# Altium footprint library 元件2.PcbLib: 204 footprints (part 11 of 13)
Each footprint in its own frame and in the unit in brackets; x right, y up, seen from the top. Pads: shape width x height; smd on the part's side, far side on the other; paste and mask are expansions set on the pad; w line width, h text height; cw(c..) or ccw(c..) is an arc to the next point about the centre after c.
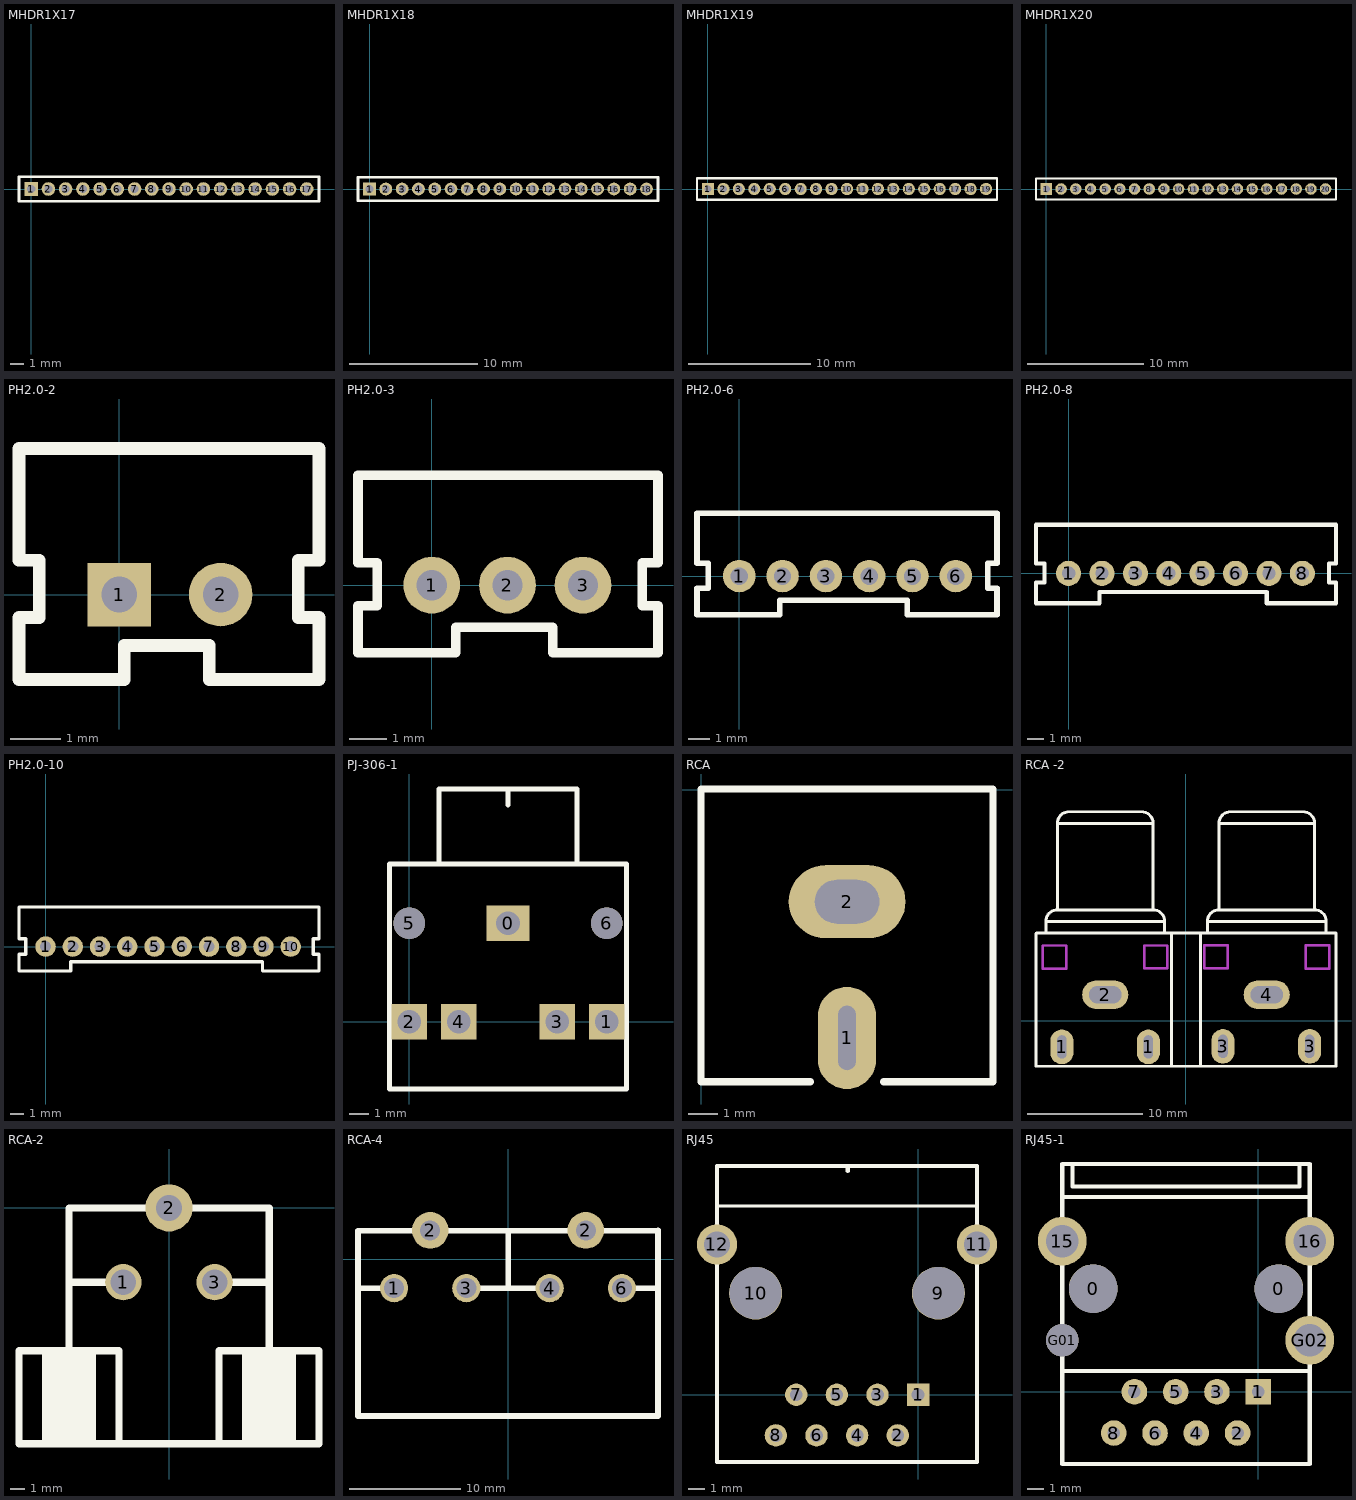
[diagram p10: the footprints below, top view; thin cyan lines are the x and y axes]

## MHDR1X17 [mm] "Connector; Header; 17 Position"
pads (17):
  rect 1x1 hole 0.6: 1(0,0)
  round 1 hole 0.6: 2(1.27,0) 3(2.54,0) 4(3.81,0) 5(5.08,0) 6(6.35,0) 7(7.62,0) 8(8.89,0) 9(10.16,0) 10(11.43,0) 11(12.7,0) 12(13.97,0) 13(15.24,0) 14(16.51,0) 15(17.78,0) 16(19.05,0) 17(20.32,0)
Top Overlay:
  lines w0.2: -0.9,-0.9 21.22,-0.9 21.22,0.9 -0.9,0.9 -0.9,-0.9
3D body "mhdr17.STEP": height 10.15, standoff 0, extent -1.27,-1.27 21.59,1.27

## MHDR1X18 [mm] "Connector; Header; 18 Position"
pads (18):
  rect 1x1 hole 0.6: 1(0,0)
  round 1 hole 0.6: 2(1.27,0) 3(2.54,0) 4(3.81,0) 5(5.08,0) 6(6.35,0) 7(7.62,0) 8(8.89,0) 9(10.16,0) 10(11.43,0) 11(12.7,0) 12(13.97,0) 13(15.24,0) 14(16.51,0) 15(17.78,0) 16(19.05,0) 17(20.32,0) 18(21.59,0)
Top Overlay:
  lines w0.2: -0.9,-0.9 22.49,-0.9 22.49,0.9 -0.9,0.9 -0.9,-0.9
3D body "mhdr18.STEP": height 10.15, standoff 0, extent -1.27,-1.27 22.86,1.27

## MHDR1X19 [mm] "Connector; Header; 19 Position"
pads (19):
  rect 1x1 hole 0.6: 1(0,0)
  round 1 hole 0.6: 2(1.27,0) 3(2.54,0) 4(3.81,0) 5(5.08,0) 6(6.35,0) 7(7.62,0) 8(8.89,0) 9(10.16,0) 10(11.43,0) 11(12.7,0) 12(13.97,0) 13(15.24,0) 14(16.51,0) 15(17.78,0) 16(19.05,0) 17(20.32,0) 18(21.59,0) 19(22.86,0)
Top Overlay:
  lines w0.2: -0.9,-0.9 -0.9,0.9 23.76,0.9 23.76,-0.9 -0.9,-0.9
3D body "mhdr19.STEP": height 10.15, standoff 0, extent -1.27,-1.27 24.13,1.27

## MHDR1X20 [mm] "Connector; Header; 20 Position"
pads (20):
  rect 1x1 hole 0.6: 1(0,0)
  round 1 hole 0.6: 2(1.27,0) 3(2.54,0) 4(3.81,0) 5(5.08,0) 6(6.35,0) 7(7.62,0) 8(8.89,0) 9(10.16,0) 10(11.43,0) 11(12.7,0) 12(13.97,0) 13(15.24,0) 14(16.51,0) 15(17.78,0) 16(19.05,0) 17(20.32,0) 18(21.59,0) 19(22.86,0) 20(24.13,0)
Top Overlay:
  lines w0.2: -0.9,-0.9 -0.9,0.9 25.03,0.9 25.03,-0.9 -0.9,-0.9
3D body "mhdr20.STEP": height 10.15, standoff 0, extent -1.27,-1.27 25.4,1.27

## PH2.0-2 [mil]
pads (2):
  rect 50x50 hole 28: 1(0,0)
  round 50 hole 28: 2(80,0)
Top Overlay:
  lines w10: -78.8,-66.93 -78.8,-18.06 -62.82,-18.06 -62.82,26.94 -78.8,26.94 -78.8,115 157.42,115 157.42,26.94 141,26.94 141,-18.06 157.42,-18.06 157.42,-66.93 71,-66.93 71,-40.19 4,-40.19 4,-66.93 -78.8,-66.93
3D body "PH2.step": height 236.22, standoff -133.86, extent -76.13,-65.57 156.15,111.59

## PH2.0-3 [mm]
pads (3):
  round 1.5 hole 0.8: 1(0,0) 2(2,0) 3(4,0)
Top Overlay:
  lines w0.254: -1.952,-1.791 -1.952,-0.55 -1.444,-0.55 -1.444,0.593 -1.952,0.593 -1.952,2.909 5.983,2.909 5.983,0.593 5.566,0.593 5.566,-0.55 5.983,-0.55 5.983,-1.791 3.2,-1.791 3.2,-1.112 0.635,-1.112 0.635,-1.791 -1.952,-1.791
3D body "PH3.step": height 6, standoff -3.4, extent -1.943,-1.681 5.957,2.819

## PH2.0-6 [mm]
pads (6):
  round 1.5 hole 0.8: 1(0,0) 2(2,0) 3(4,0) 4(6,0) 5(8,0) 6(10,0)
Top Overlay:
  lines w0.254: -1.952,-1.791 -1.952,-0.55 -1.444,-0.55 -1.444,0.593 -1.952,0.593 -1.952,2.909 11.902,2.909 11.902,0.593 11.485,0.593 11.485,-0.55 11.902,-0.55 11.902,-1.791 7.751,-1.791 7.751,-1.112 3.509,-1.112 1.858,-1.112 1.858,-1.791 -1.952,-1.791
3D body "PH6.step": height 6, standoff -3, extent -1.946,-1.702 11.954,2.798

## PH2.0-8 [mm]
pads (8):
  round 1.5 hole 0.8: 1(0,0) 2(2,0) 3(4,0) 4(6,0) 5(8,0) 6(10,0) 7(12,0) 8(14,0)
Top Overlay:
  lines w0.254: -1.952,-1.791 1.858,-1.791 1.858,-1.112 3.509,-1.112 11.866,-1.112 11.866,-1.791 16.016,-1.791 16.016,-0.55 15.599,-0.55 15.599,0.593 16.016,0.593 16.016,2.909 -1.952,2.909 -1.952,0.593 -1.444,0.593 -1.444,-0.55 -1.952,-0.55 -1.952,-1.791
3D body "PH8.step": height 6, standoff -3, extent -1.94,-1.676 15.96,2.824

## PH2.0-10 [mm]
pads (10):
  round 1.5 hole 0.8: 1(0,0) 2(2,0) 3(4,0) 4(6,0) 5(8,0) 6(10,0) 7(12,0) 8(14,0) 9(16,0) 10(18,0)
Top Overlay:
  lines w0.254: -1.952,-1.791 1.858,-1.791 1.858,-1.112 3.509,-1.112 15.93,-1.112 15.93,-1.791 20.08,-1.791 20.08,-0.55 19.663,-0.55 19.663,0.593 20.08,0.593 20.08,2.909 -1.952,2.909 -1.952,0.593 -1.444,0.593 -1.444,-0.55 -1.952,-0.55 -1.952,-1.791
3D body "PH10.step": height 6, standoff -3, extent -1.952,-1.695 19.948,2.805

## PJ-306-1 [mm]
pads (7):
  rect 2.2x1.8 hole 1.2: 0(5,5)
  rect 1.8x1.8 hole 1.2: 1(10,0) 2(0,0) 3(7.5,0) 4(2.5,0)
  round 1.6 hole 1.6 unplated: 5(0,5) 6(10,5)
Top Overlay:
  lines w0.254: 1.5,8 1.5,11.8 8.4,11.8 ; 5,11 5,11.8 ; 8.5,8 8.5,11.8 ; -1,-3.4 -1,8 11,8 11,-3.4 -1,-3.4
3D body "耳机.ST": height 3.2, standoff -10.8, extent -1.041,-3.689 11.059,11.411

## RCA [mm]
pads (2):
  oval 2x3.5 hole 0.6 slot 2.2 at 90 deg: 1(5,-8.5)
  oval 4x2.5 hole 1.5 slot 2.2 at 0 deg: 2(5.004,-3.835)
Top Overlay:
  lines w0.254: 3.75,-10 0,-10 0,0.025 10,0.025 10,-10 6.25,-10
3D body "RCA.step": height 13, standoff -3.99, extent -0.025,-9.881 9.982,9.627

## RCA -2 [mm]
pads (6):
  oval 2x3 hole 0.8 slot 2 at 90 deg: 1(-10.738,-2.261) 1(-3.245,-2.261) 3(3.219,-2.21) 3(10.738,-2.21)
  oval 4x2.5 hole 1.5 slot 2.8 at 0 deg: 2(-6.979,2.261) 4(7.017,2.261)
Top Overlay:
  lines w0.254: -1.226,-3.861 -1.226,7.569 ; 1.289,-3.861 1.289,7.595 ; 13.008,7.601 -12.954,7.601 -12.98,7.575 -12.98,-3.937 13.018,-3.937 13.018,7.617 ; -12.13,8.617 cw(c-11.13,8.617) -11.13,9.617 ; -12.13,8.617 -12.13,7.617 -12.13,8.617 ; -12.13,8.617 -1.83,8.617 ; -11.13,9.617 -11.13,17.117 ; -11.13,9.617 -2.83,9.617 ; -11.13,17.117 cw(c-10.13,17.117) -10.13,18.117 -3.83,18.117 cw(c-3.83,17.117) -2.83,17.117 ; -11.13,17.117 -2.83,17.117 ; -2.83,9.617 cw(c-2.83,8.617) -1.83,8.617 ; -2.83,9.617 -2.83,17.117 ; -2.83,9.617 -2.83,17.117 ; -1.83,8.617 -1.83,7.617 -1.83,8.617 ; 1.87,8.617 cw(c2.87,8.617) 2.87,9.617 ; 1.87,8.617 1.87,7.617 1.87,8.617 ; 1.87,8.617 12.17,8.617 ; 2.87,9.617 2.87,17.117 ; 2.87,9.617 2.87,17.117 ; 2.87,9.617 11.17,9.617 ; 2.87,17.117 cw(c3.87,17.117) 3.87,18.117 10.17,18.117 cw(c10.17,17.117) 11.17,17.117 ; 2.87,17.117 11.17,17.117 ; 11.17,9.617 cw(c11.17,8.617) 12.17,8.617 ; 11.17,9.617 11.17,17.117 ; 11.17,9.617 11.17,17.117 ; 12.17,7.617 12.17,8.617 ; 12.17,7.617 12.17,8.617 ; 12.17,7.617 12.17,8.617 ; 12.17,7.617 12.17,8.617
Keep-Out Layer:
  lines w0.2: -12.395,4.521 -10.363,4.521 -10.363,6.528 -12.395,6.528 -12.395,4.521 ; -3.607,4.547 -3.607,6.528 -1.6,6.528 -1.6,4.547 -3.607,4.547 ; 1.6,4.547 3.632,4.547 3.632,6.553 1.6,6.553 1.6,4.547 ; 10.389,4.521 12.421,4.521 12.421,6.553 10.389,6.553 10.389,4.521
Mechanical 1:
  lines w0.2: -12.395,4.521 -12.395,6.528 -10.363,6.528 -10.363,4.521 -12.395,4.521 ; -3.607,4.547 -1.6,4.547 -1.6,6.528 -3.607,6.528 -3.607,4.547 ; 1.6,4.547 1.6,6.553 3.632,6.553 3.632,4.547 1.6,4.547 ; 10.389,4.521 10.389,6.553 12.421,6.553 12.421,4.521 10.389,4.521
Mechanical 2:
  lines w0.254: -11.225,-3.289 -11.225,-1.289 -10.225,-1.289 -10.225,-3.289 -11.225,-3.289 ; -8.23,1.649 -8.23,2.849 -5.73,2.849 -5.73,1.649 -8.23,1.649 ; -3.725,-3.289 -3.725,-1.289 -2.725,-1.289 -2.725,-3.289 -3.725,-3.289 ; 2.753,-3.238 2.753,-1.238 3.753,-1.238 3.753,-3.238 2.753,-3.238 ; 5.77,1.649 5.77,2.849 8.27,2.849 8.27,1.649 5.77,1.649 ; 10.253,-3.238 10.253,-1.238 11.253,-1.238 11.253,-3.238 10.253,-3.238
3D body "av2-8-4-13.STEP": height 2.5, standoff -17, extent -12.986,-6.579 13.012,18.121

## RCA-2 [mm]
pads (3):
  round 2.54 hole 1.8: 1(-3.2,-5.2) 3(3.2,-5.2)
  round 3.3 hole 1.8: 2(0,0)
Top Overlay:
  rectangle: -8.738,-16.5 -5.309,-10
  rectangle: 5.283,-16.5 8.738,-10
  lines w0.254: -8.75,-16.5 -8.75,-10 ; -5.25,-16.5 -5.25,-10 ; 5.25,-16.5 5.25,-10 ; 8.75,-16.5 8.75,-10
  lines w0.508: -7,-5.2 -3.25,-5.2 ; -3.5,-16.5 -3.5,-10 -7,-10 -10.5,-10 -10.5,-16.5 -7,-16.5 ; 3.19,-5.2 7,-5.2 ; 3.5,-16.5 3.5,-10 7,-10 10.5,-10 10.5,-16.5 7.017,-16.5 7.017,0 ; 7,-16.5 -7,-16.5 ; 7,0 -7,0 -7,-16.5
3D body "CUI-RCJ-2273.STEP": height 28.01, standoff -4.39, extent -8.371,-19.634 12.029,0.166

## RCA-4 [mm]
pads (6):
  round 2.54 hole 1.8: 1(-10.25,-2.6) 3(-3.75,-2.6) 4(3.75,-2.6) 6(10.25,-2.6)
  round 3.3 hole 1.8: 2(-7,2.6) 2(7,2.6)
Top Overlay:
  lines w0.508: -13.483,-2.6 -10.25,-2.6 ; -3.81,-2.6 3.81,-2.6 ; 0.017,-2.505 0.017,2.575 ; 10.25,-2.6 13.467,-2.6 ; 12.971,2.575 13.479,2.575 ; 13.5,2.575 -13.5,2.575 -13.5,-14.1 13.5,-14.1 13.5,2.6
3D body "CUI-RCJ-411234.STEP": height 27.31, standoff -5.59, extent -17.324,-17.231 17.476,2.819

## RJ45 [mil]
pads (12):
  rect 55x55 hole 31.5: 1(0,0)
  round 55 hole 31.5: 2(-50,-100) 3(-100,0) 4(-150,-100) 5(-200,0) 6(-250,-100) 7(-300,0) 8(-350,-100)
  round 130 hole 127.95 unplated: 9(50,250) 10(-400,250)
  round 98.42 hole 62.99: 11(145,370) 12(-495,370)
Top Overlay:
  lines w8: -488.19,464.57 141.73,464.57
  lines w10: -495,-165.35 144.65,-165.35 145,-165 145,370 145,562.99 -495,562.99 -495,370 -495,-165 ; -173.23,551.18 -173.23,559.06
3D body "Mod-Jack-K122449007-Stig-W.STEP": height 127.85, standoff -555.12, extent -490,-172.17 139.92,556.17

## RJ45-1 [mil]
pads (14):
  round 118.11 hole 118.11: 0(-400,250) 0(50,250)
  rect 62x62 hole 30: 1(0,0)
  round 62 hole 30: 2(-50,-100) 3(-100,0) 4(-150,-100) 5(-200,0) 6(-250,-100) 7(-300,0) 8(-350,-100)
  round 118.11 hole 78.74: 15(-475,365) 16(125,365) G02(125,125)
  round 78.74 hole 78.74: G01(-475,125)
Top Overlay:
  lines w10: -475,50 125,50 ; -475,472.24 125,472.24 ; -450,547.24 -450,497.24 100,497.24 100,547.24 ; -475,-175 -475,500 -475,552.18 125,552.18 125,500 125,-175 -475,-175
3D body "RJ45-8P-Pipe-Cat6.step": height 572.83, standoff -141.73, extent -523,-293.44 169.91,651.44